# Altium footprint library General.PcbLib: 446 footprints (part 9 of 28)
Each footprint in its own frame and in the unit in brackets; x right, y up, seen from the top. Pads: shape width x height; smd on the part's side, far side on the other; paste and mask are expansions set on the pad; w line width, h text height; cw(c..) or ccw(c..) is an arc to the next point about the centre after c.
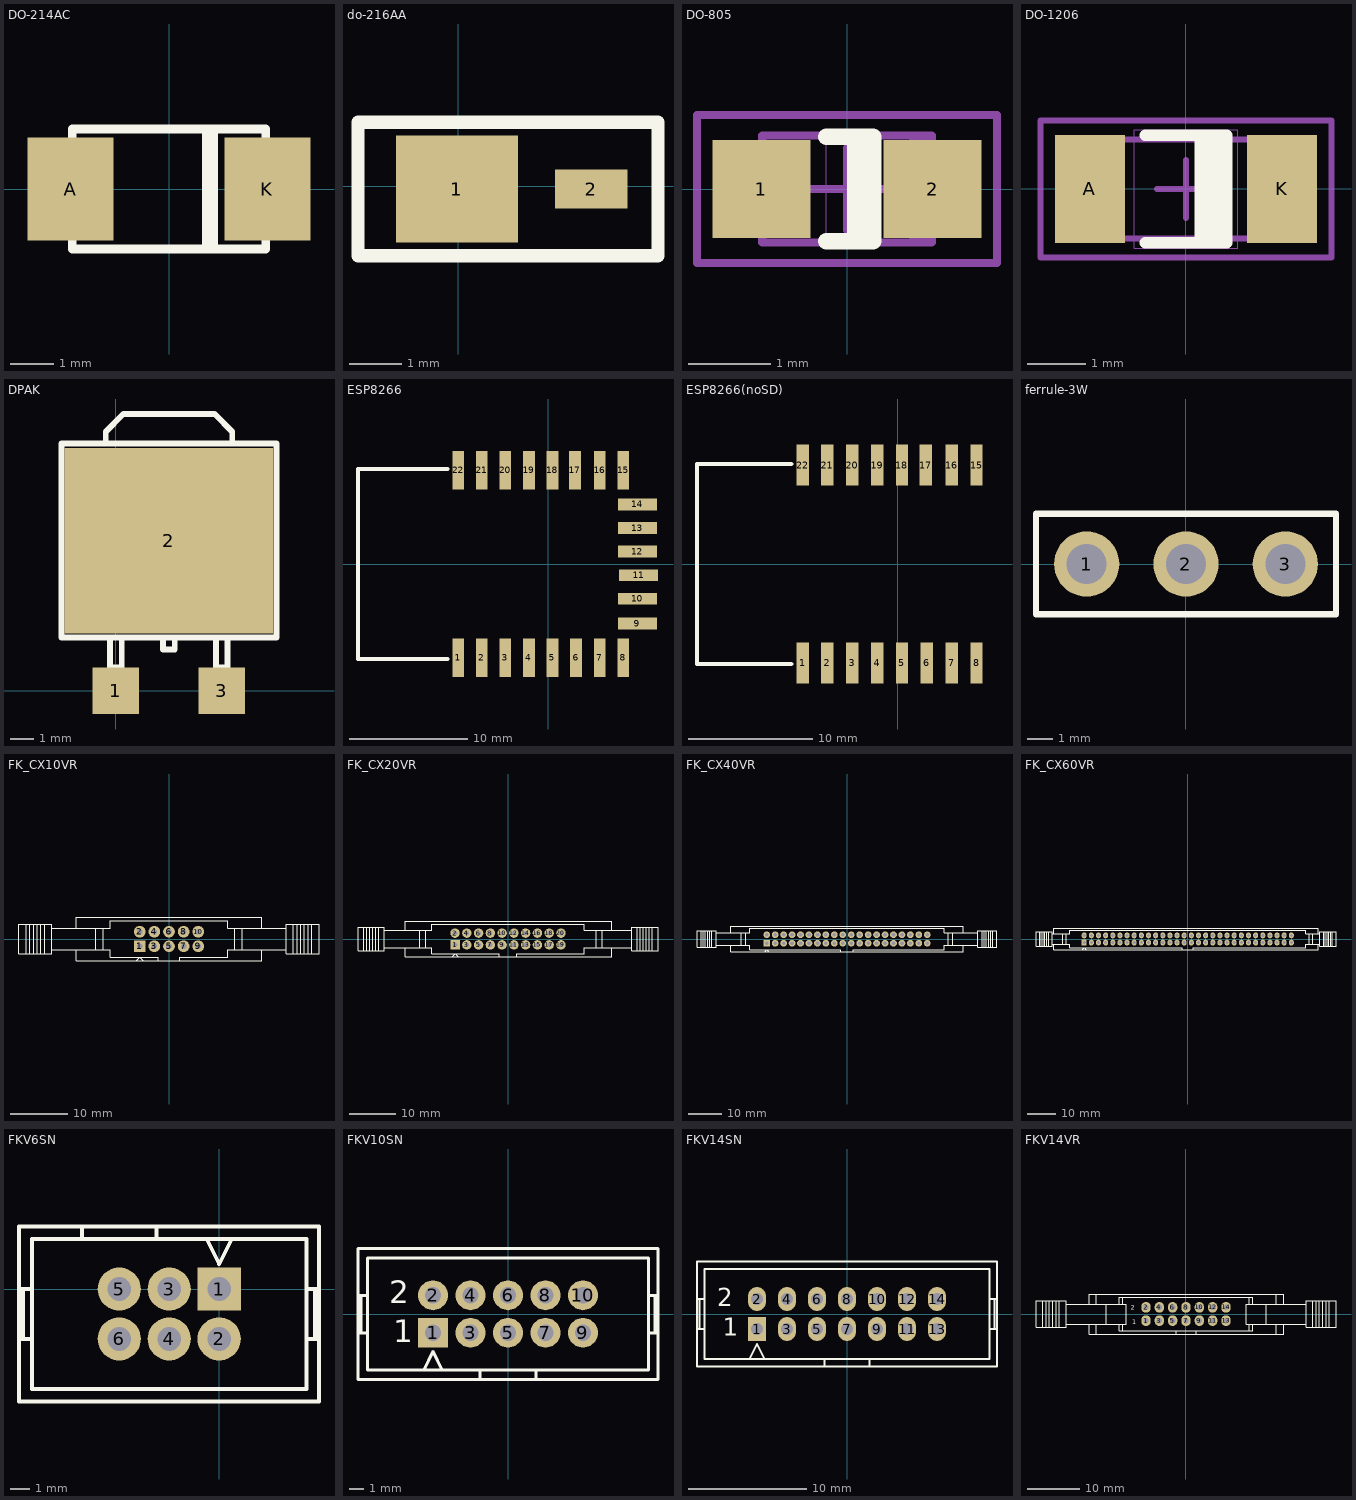
[diagram p8: the footprints below, top view; thin cyan lines are the x and y axes]

## DO-214AC [mm]
height 1.35
pads (2):
  rect 2x2.4 smd: A(-2.286,0) K(2.286,0)
Top Overlay:
  rectangle: 0.762,-1.397 1.143,1.397
  lines w0.203: -2.25,-1.143 -2.25,-1.397 2.25,-1.397 2.25,-1.143 ; -2.25,1.143 -2.25,1.397 2.25,1.397 2.25,1.143
3D body "User Library-DIOM5528X26.STEP": height 2.6, standoff 0.03, extent -2.909,-1.321 2.591,1.479

## do-216AA [mm]
pads (2):
  rect 2.32x2.03 smd: 1(-0.025,-0.051)
  rect 1.38x0.75 smd: 2(2.535,-0.051)
Top Overlay:
  lines w0.254: -1.91,-1.321 -1.91,1.219 3.805,1.219 3.805,-1.321 -1.91,-1.321

## DO-805 [mil] "Molded Diode, 2-Leads, Body 2.0x1.2mm, IPC Medium Density"
height 39
pads (2):
  rect 47x47 smd: 1(-41,0) 2(41,0)
Top Overlay:
  rectangle: 0,-25 12.56,25
  lines w7.87: -10,-25 12.56,-25 12.56,25 -10,25
Mechanical 10:
  lines w0.39: -10,-25 -10,25 10,25 10,-25 -10,-25
Mechanical 13:
  rectangle: 29.64,-25.59 40.55,25.59
  lines w3.94: -40.55,-25.59 40.55,-25.59 40.55,25.59 -40.55,25.59 -40.55,-25.59
Mechanical 15:
  lines w3.94: -19.68,0 19.68,0 ; 0,-19.68 0,19.68 ; -71.85,-35.43 71.85,-35.43 71.85,35.43 -71.85,35.43 -71.85,-35.43
3D body: height 39.29, standoff 39, extent 18,-22 36,23
3D body: height 39, standoff 0, extent -40.55,-25.59 40.55,25.59

## DO-1206 [mm] "MELF Diode, 2-Leads, Body 3.5x1.7mm, IPC Medium Density"
height 1.7
pads (2):
  rect 1.2x1.85 smd: A(-1.65,0) K(1.65,0)
Top Overlay:
  rectangle: 0.15,-0.925 0.7,0.925
  lines w0.2: -0.7,-0.925 0.7,-0.925 0.7,0.925 -0.7,0.925
Mechanical 10:
  lines w0.01: -0.889,-1.016 -0.889,1.016 0.889,1.016 0.889,-1.016 -0.889,-1.016
Mechanical 13:
  rectangle: 1.352,-0.85 1.85,0.85
  lines w0.1: -1.85,-0.85 1.85,-0.85 1.85,0.85 -1.85,0.85 -1.85,-0.85
Mechanical 15:
  lines w0.1: -0.5,0 0.5,0 ; 0,-0.5 0,0.5 ; -2.5,-1.175 2.5,-1.175 2.5,1.175 -2.5,1.175 -2.5,-1.175
3D body: height 1.71, standoff 1.7, extent 1.041,-0.864 1.499,0.864
3D body: height 1.7, standoff 0, extent -1.85,-0.85 1.85,0.85

## DPAK [mm]
pads (3):
  rect 2x2 smd: 1(0,0) 3(4.572,0)
  rect 9x8 smd: 2(2.286,6.477)
Top Overlay:
  lines w0.254: -0.437,10.676 -0.437,11.184 0.325,11.946 4.262,11.946 5.024,11.184 5.024,10.676 ; -0.254,2.286 -0.254,1.016 0.254,1.016 0.254,2.286 ; 2.032,2.286 2.032,1.778 2.54,1.778 2.54,2.286 ; 4.318,2.286 4.318,1.016 4.826,1.016 4.826,2.286 ; -2.342,2.294 6.929,2.294 6.929,10.676 -2.342,10.676 -2.342,2.294
3D body "User Library-DPAK_TO-252AA_.STEP": height 2.42, standoff 0.02, extent -1.081,0.379 5.653,10.479

## ESP8266 [mm]
pads (22):
  rect 1x3.3 smd: 1(-7.65,-7.95) 2(-5.65,-7.95) 3(-3.65,-7.95) 4(-1.65,-7.95) 5(0.35,-7.95) 6(2.35,-7.95) 7(4.35,-7.95) 8(6.35,-7.95) 15(6.35,7.95) 16(4.35,7.95) 17(2.25,7.95) 18(0.35,7.95) 19(-1.65,7.95) 20(-3.65,7.95) 21(-5.65,7.95) 22(-7.65,7.95)
  rect 3.3x1 smd: 9(7.55,-5.05) 10(7.55,-2.95) 11(7.65,-0.95) 12(7.55,1.05) 13(7.55,3.05) 14(7.55,5.05)
Top Overlay:
  lines w0.349: -8.55,-8.05 -16.15,-8.05 -16.15,8.05 -8.55,8.05
3D body "User Library-WIFI - ESP8266M0D.STEP": height 3.12, standoff -0.01, extent -16.176,-8.116 8.034,8.104

## ESP8266(noSD) [mm]
pads (16):
  rect 1x3.3 smd: 1(-7.65,-7.95) 2(-5.65,-7.95) 3(-3.65,-7.95) 4(-1.65,-7.95) 5(0.35,-7.95) 6(2.35,-7.95) 7(4.35,-7.95) 8(6.35,-7.95) 15(6.35,7.95) 16(4.35,7.95) 17(2.25,7.95) 18(0.35,7.95) 19(-1.65,7.95) 20(-3.65,7.95) 21(-5.65,7.95) 22(-7.65,7.95)
Top Overlay:
  lines w0.349: -8.55,-8.05 -16.15,-8.05 -16.15,8.05 -8.55,8.05
3D body "User Library-WIFI - ESP8266M0D.STEP": height 3.12, standoff -0.01, extent -16.176,-8.116 8.034,8.104

## ferrule-3W [mm]
pads (3):
  round 2.6 hole 1.6: 1(-3.96,0) 2(0,0) 3(3.96,0)
Top Overlay:
  lines w0.254: -5.98,-2 5.98,-2 5.98,2 -5.98,2 -5.98,-2
3D body "ferrule1.step": height 12.3, standoff -2.3, extent 2.218,-1.75 5.703,1.75
3D body "ferrule1.step": height 12.3, standoff -2.3, extent -1.742,-1.75 1.743,1.75
3D body "ferrule1.step": height 12.3, standoff -2.3, extent -5.702,-1.75 -2.217,1.75

## FK_CX10VR [mil]
pads (10):
  rect 80x80 hole 39.37: 1(-200,-50)
  round 80 hole 39.37: 2(-200,50) 3(-100,-50) 4(-100,50) 5(0,-50) 6(0,50) 7(100,-50) 8(100,50) 9(200,-50) 10(200,50)
Top Overlay:
  lines w8: -975,-100 -975,100 ; -950,-100 -950,100 ; -925,-100 -925,100 ; -900,-100 -900,100 ; -875,-100 -875,100 ; -850,-100 -850,100 ; -800,-75 -633.33,-75 ; -800,75 -633.33,75 ; -500,-75 -500,75 ; -450,-75 -450,75 ; -225,-150 -200,-125 -175,-150 ; -75,-150 -75,-125 -400,-125 -400,-75 -633.33,-75 ; 75,-150 75,-125 400,-125 400,-75 633.33,-75 ; 450,-75 450,75 ; 500,-75 500,75 ; 800,-75 633.33,-75 ; 800,75 633.33,75 ; 850,-100 850,100 ; 875,-100 875,100 ; 900,-100 900,100 ; 925,-100 925,100 ; 950,-100 950,100 ; 975,-100 975,100 ; -633.33,-75 -633.33,-150 633.33,-150 633.33,-75 ; -633.33,75 -633.33,150 633.33,150 633.33,75 ; -633.33,75 -400,75 -400,125 400,125 400,75 633.33,75 ; -1025,-100 -800,-100 -800,100 -1025,100 -1025,-100 ; 800,-100 1025,-100 1025,100 800,100 800,-100

## FK_CX20VR [mil]
pads (20):
  rect 80x80 hole 39.37: 1(-450,-50)
  round 80 hole 39.37: 2(-450,50) 3(-350,-50) 4(-350,50) 5(-250,-50) 6(-250,50) 7(-150,-50) 8(-150,50) 9(-50,-50) 10(-50,50) 11(50,-50) 12(50,50) 13(150,-50) 14(150,50) 15(250,-50) 16(250,50) 17(350,-50) 18(350,50) 19(450,-50) 20(450,50)
Top Overlay:
  lines w8: -1225,-100 -1225,100 ; -1200,-100 -1200,100 ; -1175,-100 -1175,100 ; -1150,-100 -1150,100 ; -1125,-100 -1125,100 ; -1100,-100 -1100,100 ; -1050,-75 -650,-75 -650,-125 -75,-125 -75,-150 ; -1050,75 -650,75 -650,125 650,125 650,75 1050,75 ; -875,-75 -875,-150 883.33,-150 883.33,-75 ; -875,75 -875,150 883.33,150 883.33,75 ; -750,-75 -750,75 ; -700,-75 -700,75 ; -475,-150 -450,-125 -425,-150 ; 75,-150 75,-125 650,-125 650,-75 1050,-75 ; 750,-75 750,75 ; 800,-75 800,75 ; 1100,-100 1100,100 ; 1125,-100 1125,100 ; 1150,-100 1150,100 ; 1175,-100 1175,100 ; 1200,-100 1200,100 ; 1225,-100 1225,100 ; -1275,-100 -1275,100 -1050,100 -1050,-100 -1275,-100 ; 1050,-100 1050,100 1275,100 1275,-100 1050,-100

## FK_CX40VR [mil]
pads (40):
  rect 80x80 hole 43.31: 1(-950,-50)
  round 80 hole 43.31: 2(-950,50) 3(-850,-50) 4(-850,50) 5(-750,-50) 6(-750,50) 7(-650,-50) 8(-650,50) 9(-550,-50) 10(-550,50) 11(-450,-50) 12(-450,50) 13(-350,-50) 14(-350,50) 15(-250,-50) 16(-250,50) 17(-150,-50) 18(-150,50) 19(-50,-50) 20(-50,50) 21(50,-50) 22(50,50) 23(150,-50) 24(150,50) 25(250,-50) 26(250,50) 27(350,-50) 28(350,50) 29(450,-50) 30(450,50) 31(550,-50) 32(550,50) 33(650,-50) 34(650,50) 35(750,-50) 36(750,50) 37(850,-50) 38(850,50) 39(950,-50) 40(950,50)
Top Overlay:
  lines w8: -1725,-100 -1725,100 ; -1700,-100 -1700,100 ; -1675,-100 -1675,100 ; -1650,-100 -1650,100 ; -1625,-100 -1625,100 ; -1600,-100 -1600,100 ; -1550,-75 -1150,-75 -1150,-125 -75,-125 -75,-150 ; -1550,75 -1150,75 -1150,125 1150,125 1150,75 1550,75 ; -1375,-75 -1375,-150 1375,-150 1375,-75 ; -1375,75 -1375,150 1375,150 1375,75 ; -1250,-75 -1250,75 ; -1200,-75 -1200,75 ; -975,-150 -950,-125 -925,-150 ; 75,-150 75,-125 1150,-125 1150,-75 1550,-75 ; 1200,-75 1200,75 ; 1250,-75 1250,75 ; 1600,-100 1600,100 ; 1625,-100 1625,100 ; 1650,-100 1650,100 ; 1675,-100 1675,100 ; 1700,-100 1700,100 ; 1725,-100 1725,100 ; -1775,-100 -1775,100 -1550,100 -1550,-100 -1775,-100 ; 1550,-100 1550,100 1775,100 1775,-100 1550,-100

## FK_CX60VR [mil]
pads (60):
  rect 70x80 hole 43.31: 1(-1450,-50)
  oval 70x80 hole 43.31: 2(-1450,50) 3(-1350,-50) 4(-1350,50) 5(-1250,-50) 6(-1250,50) 7(-1150,-50) 8(-1150,50) 9(-1050,-50) 10(-1050,50) 11(-950,-50) 12(-950,50) 13(-850,-50) 14(-850,50) 15(-750,-50) 16(-750,50) 17(-650,-50) 18(-650,50) 19(-550,-50) 20(-550,50) 21(-450,-50) 22(-450,50) 23(-350,-50) 24(-350,50) 25(-250,-50) 26(-250,50) 27(-150,-50) 28(-150,50) 29(-50,-50) 30(-50,50) 31(50,-50) 32(50,50) 33(150,-50) 34(150,50) 35(250,-50) 36(250,50) 37(350,-50) 38(350,50) 39(450,-50) 40(450,50) 41(550,-50) 42(550,50) 43(650,-50) 44(650,50) 45(750,-50) 46(750,50) 47(850,-50) 48(850,50) 49(950,-50) 50(950,50) 51(1050,-50) 52(1050,50) 53(1150,-50) 54(1150,50) 55(1250,-50) 56(1250,50) 57(1350,-50) 58(1350,50) 59(1450,-50) 60(1450,50)
Top Overlay:
  lines w8: -2075,-100 -2075,100 ; -2050,-100 -2050,100 ; -2025,-100 -2025,100 ; -2000,-100 -2000,100 ; -1975,-100 -1975,100 ; -1950,-100 -1950,100 ; -1900,-75 -1650,-75 -1650,-125 -75,-125 -75,-150 ; -1900,75 -1650,75 -1650,125 1650,125 1650,75 1850,75 ; -1875,-75 -1875,-150 1825,-150 1825,-75 ; -1875,75 -1875,150 1825,150 1825,75 ; -1750,-75 -1750,75 ; -1700,-75 -1700,75 ; -1475,-150 -1450,-125 -1425,-150 ; 75,-150 75,-125 1650,-125 1650,-75 1850,-75 ; 1700,-75 1700,75 ; 1750,-75 1750,75 ; 1900,-100 1900,100 ; 1925,-100 1925,100 ; 1950,-100 1950,100 ; 1975,-100 1975,100 ; 2000,-100 2000,100 ; 2025,-100 2025,100 ; -2125,-100 -2125,100 -1900,100 -1900,-100 -2125,-100 ; 1850,-100 1850,100 2075,100 2075,-100 1850,-100

## FKV6SN [mm]
pads (6):
  rect 2.2x2.2 hole 1.2: 1(0,0)
  round 2.2 hole 1.2: 2(0,-2.54) 3(-2.54,0) 4(-2.54,-2.54) 5(-5.08,0) 6(-5.08,-2.54)
Top Overlay:
  lines w0.203: -10.18,-2.54 -9.525,-2.54 ; -10.18,0 -9.525,0 ; -9.98,-2.54 -9.98,0 ; -6.985,3.175 -6.985,2.54 ; -3.175,3.175 -3.175,2.54 ; -0.635,2.54 0,1.27 0.635,2.54 ; 4.445,-2.54 5.08,-2.54 ; 4.445,0 5.08,0 ; 4.868,-2.54 4.868,0 ; -6.985,2.54 -3.175,2.54 ; -6.985,2.54 -9.525,2.54 -9.525,-5.08 4.445,-5.08 4.445,2.54 -3.175,2.54 ; -10.18,-5.715 -10.18,3.175 5.08,3.175 5.08,-5.715 -10.18,-5.715
3D body "User Library-IDC Socket Male 6pin Straight THT Goldplated 2_54mm.STEP": height 8.91, standoff -3.49, extent -10.144,-5.932 5.076,2.918

## FKV10SN [mil]
pads (10):
  rect 80x80 hole 43.31: 1(-200,-50)
  round 80 hole 43.31: 2(-200,50) 3(-100,-50) 4(-100,50) 5(0,-50) 6(0,50) 7(100,-50) 8(100,50) 9(200,-50) 10(200,50)
Top Overlay:
  lines w8: -400,-50 -375,-50 ; -400,50 -375,50 ; -391.67,-50 -391.67,50 ; -225,-150 -200,-100 -175,-150 ; -75,-175 -75,-150 ; 75,-175 75,-150 ; 375,-50 400,-50 ; 375,50 400,50 ; 391.67,-50 391.67,50 ; -75,-150 -375,-150 -375,150 375,150 375,-150 75,-150 ; -75,-150 75,-150 ; -400,-175 -400,175 400,175 400,-175 -400,-175
  text "2" at -317,29 h60
  text "1" at -306,-76 h60

## FKV14SN [mil]
height 47.24
pads (14):
  rect 60x80 hole 39.37: 1(-300,-50)
  oval 60x80 hole 39.37: 2(-300,50) 3(-200,-50) 4(-200,50) 5(-100,-50) 6(-100,50) 7(0,-50) 8(0,50) 9(100,-50) 10(100,50) 11(200,-50) 12(200,50) 13(300,-50) 14(300,50)
Top Overlay:
  lines w8: -500,-50 -475,-50 ; -500,50 -475,50 ; -491.67,-50 -491.67,50 ; -325,-150 -300,-100 -275,-150 ; -75,-175 -75,-150 ; 75,-175 75,-150 ; 475,-50 500,-50 ; 475,50 500,50 ; 491.67,-50 491.67,50 ; -75,-150 -475,-150 -475,150 475,150 475,-150 75,-150 ; -75,-150 75,-150 ; -500,-175 -500,175 500,175 500,-175 -500,-175
  text "1" at -415,-73 h60
  text "2" at -432,26 h60

## FKV14VR [mil]
pads (14):
  oval 70x80 hole 39.37: 1(-299.78,-49.8) 2(-299.78,50.2) 3(-199.78,-49.8) 4(-199.78,50.2) 5(-99.78,-49.8) 6(-99.78,50.2) 7(0.22,-49.8) 8(0.22,50.2) 9(100.22,-49.8) 10(100.22,50.2) 11(200.22,-49.8) 12(200.22,50.2) 13(300.22,-49.8) 14(300.22,50.2)
Top Overlay:
  lines w8: -1074.78,-99.8 -1074.78,100.2 ; -1049.78,-99.8 -1049.78,100.2 ; -1024.78,-99.8 -1024.78,100.2 ; -999.78,-99.8 -999.78,100.2 ; -974.78,-99.8 -974.78,100.2 ; -949.78,-99.8 -949.78,100.2 ; -899.78,-74.8 -633.11,-74.8 -499.78,-74.8 ; -899.78,75.2 -633.11,75.2 -499.78,75.2 ; -724.78,-74.8 -724.78,-149.79 733.55,-149.79 733.55,-74.8 ; -724.78,75.2 -724.78,150.21 733.55,150.21 733.55,75.2 500.22,75.2 ; -674.78,-149.79 -674.78,-74.8 ; -674.78,75.2 -674.78,150.21 ; -599.78,-74.8 -599.78,75.2 ; -474.78,-124.8 -474.78,-74.8 ; -474.78,75.2 -474.78,125.2 ; -74.78,-149.79 -74.78,-124.8 ; 75.22,-149.79 75.22,-124.8 ; 475.22,-124.8 475.22,-74.8 ; 475.22,75.2 475.22,125.2 ; 600.22,-74.8 600.22,75.2 ; 633.55,75.2 900.22,75.2 ; 675.22,-149.79 675.22,-74.8 ; 675.22,75.2 675.22,150.21 ; 900.22,-74.8 633.55,-74.8 500.22,-74.8 ; 950.22,-99.8 950.22,100.2 ; 975.22,-99.8 975.22,100.2 ; 1000.22,-99.8 1000.22,100.2 ; 1025.22,-99.8 1025.22,100.2 ; 1050.22,-99.8 1050.22,100.2 ; 1075.22,-99.8 1075.22,100.2 ; -499.78,-74.8 -499.78,-124.8 -74.78,-124.8 ; -499.78,-74.8 -449.78,-74.8 -449.78,75.2 -499.78,75.2 ; -499.78,75.2 -499.78,125.2 500.22,125.2 500.22,75.2 ; -74.78,-124.8 75.22,-124.8 ; 75.22,-124.8 500.22,-124.8 500.22,-74.8 ; 500.22,-74.8 450.22,-74.8 450.22,75.2 500.22,75.2 ; -1124.78,-99.8 -899.78,-99.8 -899.78,100.2 -1124.78,100.2 -1124.78,-99.8 ; 900.22,-99.8 1125.22,-99.8 1125.22,100.2 900.22,100.2 900.22,-99.8
  text "1" at -401.78,-77.8 h35
  text "2" at -413.78,32.2 h35